# Altium footprint library hphonglib.PcbLib: 1250 footprints (part 67 of 79)
Each footprint in its own frame and in the unit in brackets; x right, y up, seen from the top. Pads: shape width x height; smd on the part's side, far side on the other; paste and mask are expansions set on the pad; w line width, h text height; cw(c..) or ccw(c..) is an arc to the next point about the centre after c.
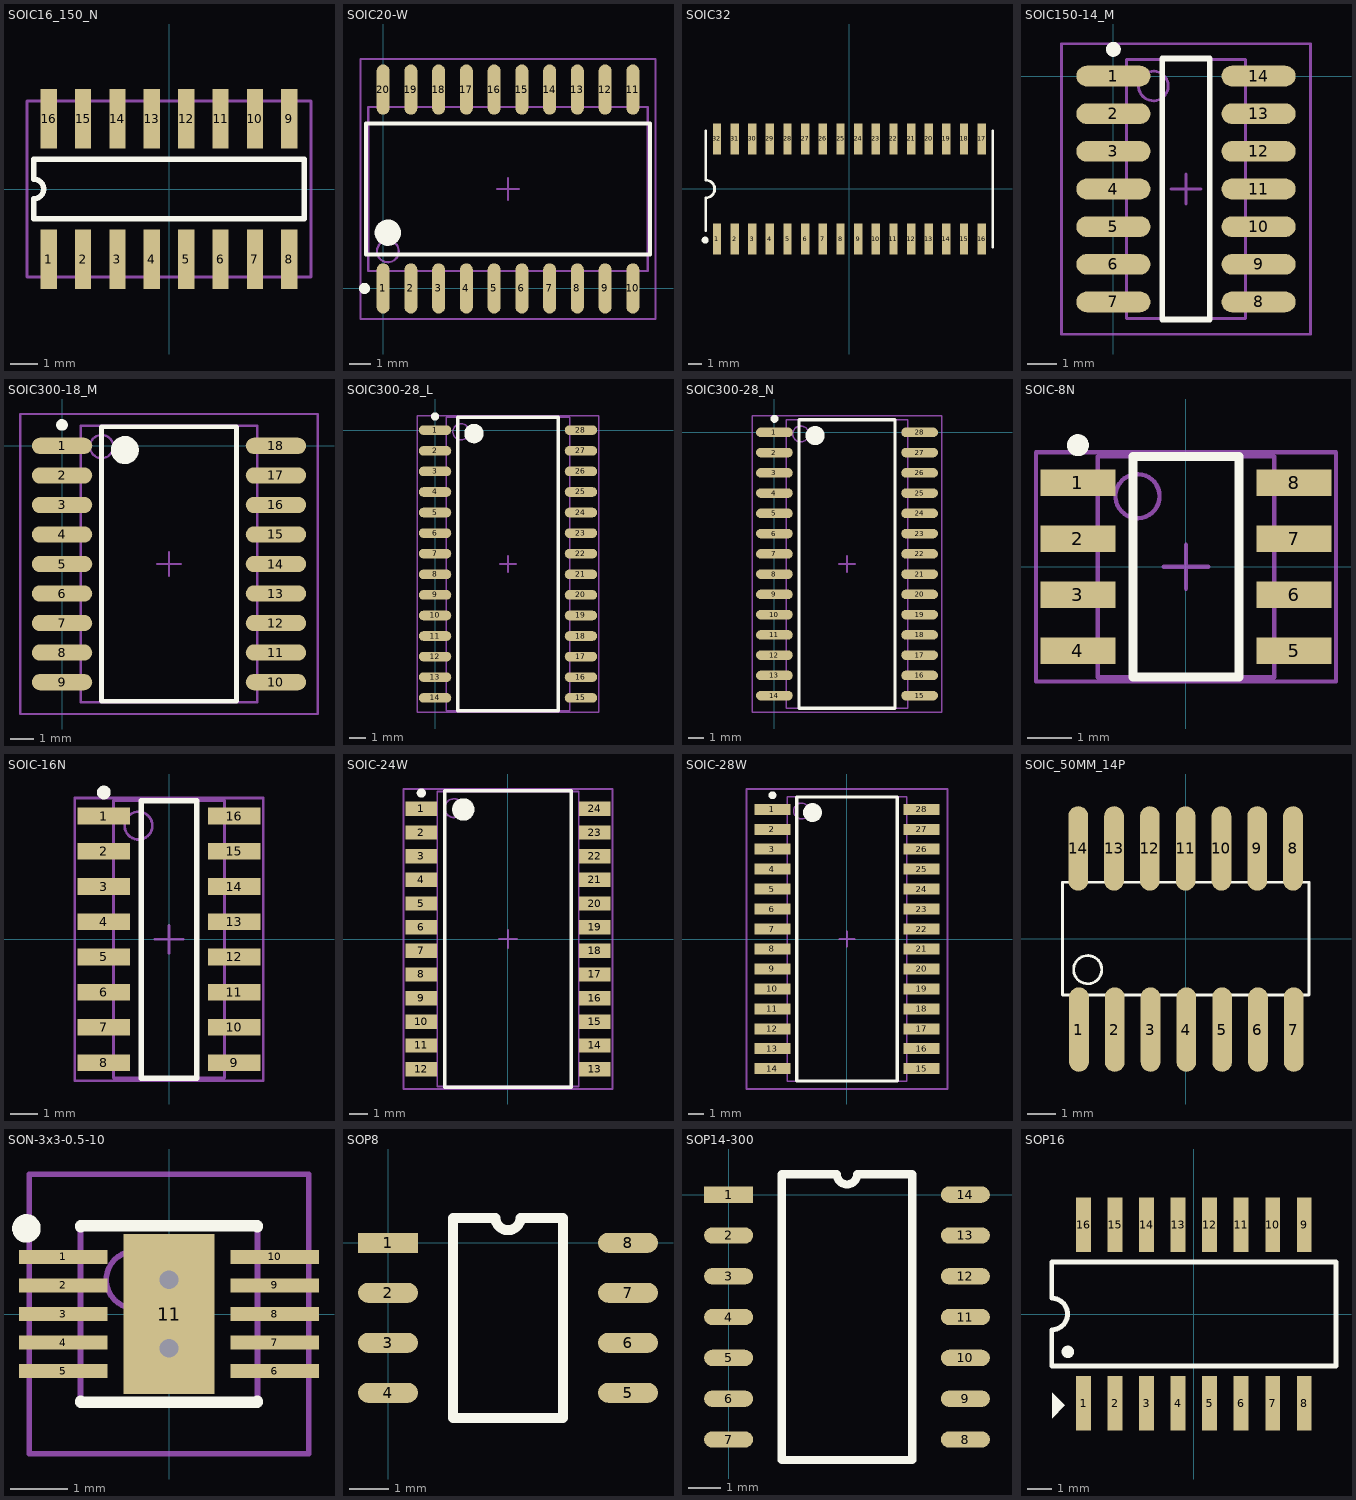
[diagram p66: the footprints below, top view; thin cyan lines are the x and y axes]

## SOIC16_150_N [mm] "Small Outline; 16 Leads; Body Width 3.5 mm; Pitch 1.27 mm"
pads (16):
  rect 0.6x2.2 smd: 1(-4.445,-2.6) 2(-3.175,-2.6) 3(-1.905,-2.6) 4(-0.635,-2.6) 5(0.635,-2.6) 6(1.905,-2.6) 7(3.175,-2.6) 8(4.445,-2.6) 9(4.445,2.6) 10(3.175,2.6) 11(1.905,2.6) 12(0.635,2.6) 13(-0.635,2.6) 14(-1.905,2.6) 15(-3.175,2.6) 16(-4.445,2.6)
Top Overlay:
  lines w0.2: -5,-1.1 5,-1.1 5,1.1 -5,1.1 -5,0.367 cw(c-5,0) -5,-0.367 -5,-1.1
Mechanical 15:
  lines w0.1: -5.25,-3.25 -5.25,3.25 5.25,3.25 5.25,-3.25 -5.25,-3.25
3D body "SOIC16-150.STEP": height 1.75, standoff 0, extent -4.9,-2.875 4.9,2.925

## SOIC20-W [mm] "SOIC, 20-Leads, Body 12.8x7.5mm, Pitch 1.27mm, IPC Medium Density"
height 2.65
pads (20):
  oval 0.6x2.3 smd: 1(0,0) 2(1.27,0) 3(2.54,0) 4(3.81,0) 5(5.08,0) 6(6.35,0) 7(7.62,0) 8(8.89,0) 9(10.16,0) 10(11.43,0) 11(11.43,9.1) 12(10.16,9.1) 13(8.89,9.1) 14(7.62,9.1) 15(6.35,9.1) 16(5.08,9.1) 17(3.81,9.1) 18(2.54,9.1) 19(1.27,9.1) 20(0,9.1)
Top Overlay:
  circle w0.6: c0.215,2.55 r0.3
  circle w0.25: c-0.85,0 r0.125
  lines w0.2: -0.785,1.55 -0.785,7.55 12.215,7.55 12.215,1.55 -0.785,1.55
Mechanical 13:
  circle w0.1: c0.215,1.7 r0.5
  lines w0.1: -0.685,0.8 -0.685,8.3 12.115,8.3 12.115,0.8 -0.685,0.8
Mechanical 15:
  lines w0.1: 5.215,4.55 6.215,4.55 ; 5.715,4.05 5.715,5.05 ; -1.035,-1.4 -1.035,10.5 12.465,10.5 12.465,-1.4 -1.035,-1.4
3D body: height 2.65, standoff 0, extent -0.685,0.8 12.115,8.3

## SOIC32 [mm] "Small Outline; 32 Leads; Body Width 5.2 mm; Pitch 1.27 mm"
pads (32):
  rect 0.6x2.2 smd: 1(-9.525,-3.6) 2(-8.255,-3.6) 3(-6.985,-3.6) 4(-5.715,-3.6) 5(-4.445,-3.6) 6(-3.175,-3.6) 7(-1.905,-3.6) 8(-0.635,-3.6) 9(0.635,-3.6) 10(1.905,-3.6) 11(3.175,-3.6) 12(4.445,-3.6) 13(5.715,-3.6) 14(6.985,-3.6) 15(8.255,-3.6) 16(9.525,-3.6) 17(9.525,3.6) 18(8.255,3.6) 19(6.985,3.6) 20(5.715,3.6) 21(4.445,3.6) 22(3.175,3.6) 23(1.905,3.6) 24(0.635,3.6) 25(-0.635,3.6) 26(-1.905,3.6) 27(-3.175,3.6) 28(-4.445,3.6) 29(-5.715,3.6) 30(-6.985,3.6) 31(-8.255,3.6) 32(-9.525,3.6)
Top Overlay:
  circle w0.25: c-10.375,-3.676 r0.125
  lines w0.2: -10.325,-2.996 -10.325,-0.635 ccw(c-10.325,0) -10.325,0.635 -10.325,4.191 ; 10.325,-4.191 10.325,4.191

## SOIC150-14_M [mm] "SOIC, 14-Leads, Body 8.7x3.9mm, Pitch 1.27mm, IPC Low Density"
height 1.76
pads (14):
  oval 2.5x0.7 smd: 1(0,0) 2(0,-1.27) 3(0,-2.54) 4(0,-3.81) 5(0,-5.08) 6(0,-6.35) 7(0,-7.62) 8(4.9,-7.62) 9(4.9,-6.35) 10(4.9,-5.08) 11(4.9,-3.81) 12(4.9,-2.54) 13(4.9,-1.27) 14(4.9,0)
Top Overlay:
  circle w0.25: c0,0.9 r0.125
  lines w0.2: 1.65,-8.21 3.25,-8.21 3.25,0.59 1.65,0.59 1.65,-8.21
Mechanical 13:
  circle w0.1: c1.35,-0.335 r0.5
  lines w0.1: 0.45,-8.185 4.45,-8.185 4.45,0.565 0.45,0.565 0.45,-8.185
Mechanical 15:
  lines w0.1: 1.95,-3.81 2.95,-3.81 ; 2.45,-4.31 2.45,-3.31 ; -1.75,-8.71 6.65,-8.71 6.65,1.09 -1.75,1.09 -1.75,-8.71
3D body: height 0.25, standoff 0.01, extent -0.575,-4.05 0.525,-3.55
3D body: height 0.25, standoff 0.01, extent -0.575,-1.5 0.525,-1
3D body: height 0.25, standoff 0.01, extent -0.575,-2.775 0.525,-2.275
3D body: height 0.25, standoff 0.01, extent -0.575,-0.25 0.525,0.25
3D body: height 0.25, standoff 0.01, extent -0.525,-6.6 0.575,-6.1
3D body: height 0.25, standoff 0.01, extent -0.525,-7.875 0.575,-7.375
3D body: height 0.25, standoff 0.01, extent -0.525,-5.35 0.575,-4.85
3D body: height 0.25, standoff 0.01, extent 4.3,-0.225 5.4,0.275
3D body: height 0.25, standoff 0.01, extent 4.3,-2.775 5.4,-2.275
3D body: height 0.25, standoff 0.01, extent 4.3,-1.5 5.4,-1
3D body: height 0.25, standoff 0.01, extent 4.3,-4.025 5.4,-3.525
3D body: height 0.25, standoff 0.01, extent 4.35,-6.6 5.45,-6.1
3D body: height 0.25, standoff 0.01, extent 4.35,-5.325 5.45,-4.825
3D body: height 0.25, standoff 0.01, extent 4.35,-7.85 5.45,-7.35
3D body: height 1.76, standoff 1.74, extent 0.775,-0.575 1.575,0.2
3D body: height 1.75, standoff 0, extent 0.45,-8.185 4.45,0.565

## SOIC300-18_M [mm] "SOIC, 18-Leads, Body 11.5x7.5mm, Pitch 1.27mm, IPC Low Density"
height 2.65
pads (18):
  oval 2.6x0.7 smd: 1(0,0) 2(0,-1.27) 3(0,-2.54) 4(0,-3.81) 5(0,-5.08) 6(0,-6.35) 7(0,-7.62) 8(0,-8.89) 9(0,-10.16) 10(9.2,-10.16) 11(9.2,-8.89) 12(9.2,-7.62) 13(9.2,-6.35) 14(9.2,-5.08) 15(9.2,-3.81) 16(9.2,-2.54) 17(9.2,-1.27) 18(9.2,0)
Top Overlay:
  circle w0.25: c0,0.9 r0.125
  circle w0.6: c2.7,-0.18 r0.3
  lines w0.2: 1.7,-10.98 1.7,0.82 7.5,0.82 7.5,-10.98 1.7,-10.98
Mechanical 13:
  circle w0.1: c1.7,-0.03 r0.5
  lines w0.1: 0.8,-11.03 0.8,0.87 8.4,0.87 8.4,-11.03 0.8,-11.03
Mechanical 15:
  lines w0.1: 4.1,-5.08 5.1,-5.08 ; 4.6,-5.58 4.6,-4.58 ; -1.8,-11.53 -1.8,1.37 11,1.37 11,-11.53 -1.8,-11.53
3D body: height 2.65, standoff 0, extent 0.8,-11.03 8.4,0.87

## SOIC300-28_L [mm] "SOIC, 28-Leads, Body 17.9x7.5mm, Pitch 1.27mm, IPC High Density"
height 2.65
pads (28):
  oval 2x0.6 smd: 1(0,0) 2(0,-1.27) 3(0,-2.54) 4(0,-3.81) 5(0,-5.08) 6(0,-6.35) 7(0,-7.62) 8(0,-8.89) 9(0,-10.16) 10(0,-11.43) 11(0,-12.7) 12(0,-13.97) 13(0,-15.24) 14(0,-16.51) 15(9,-16.51) 16(9,-15.24) 17(9,-13.97) 18(9,-12.7) 19(9,-11.43) 20(9,-10.16) 21(9,-8.89) 22(9,-7.62) 23(9,-6.35) 24(9,-5.08) 25(9,-3.81) 26(9,-2.54) 27(9,-1.27) 28(9,0)
Top Overlay:
  circle w0.6: c2.4,-0.205 r0.3
  circle w0.25: c0,0.85 r0.125
  lines w0.2: 1.4,-17.305 7.6,-17.305 7.6,0.795 1.4,0.795 1.4,-17.305
Mechanical 13:
  circle w0.1: c1.6,-0.1 r0.5
  lines w0.1: 0.7,-17.31 8.3,-17.31 8.3,0.8 0.7,0.8 0.7,-17.31
Mechanical 15:
  lines w0.1: 4,-8.255 5,-8.255 ; 4.5,-8.755 4.5,-7.755 ; -1.1,-17.405 10.1,-17.405 10.1,0.895 -1.1,0.895 -1.1,-17.405
3D body: height 2.65, standoff 0, extent 0.7,-17.31 8.3,0.8

## SOIC300-28_N [mm] "SOIC, 28-Leads, Body 17.9x7.5mm, Pitch 1.27mm, IPC Medium Density"
height 2.65
pads (28):
  oval 2.3x0.6 smd: 1(0,0) 2(0,-1.27) 3(0,-2.54) 4(0,-3.81) 5(0,-5.08) 6(0,-6.35) 7(0,-7.62) 8(0,-8.89) 9(0,-10.16) 10(0,-11.43) 11(0,-12.7) 12(0,-13.97) 13(0,-15.24) 14(0,-16.51) 15(9.1,-16.51) 16(9.1,-15.24) 17(9.1,-13.97) 18(9.1,-12.7) 19(9.1,-11.43) 20(9.1,-10.16) 21(9.1,-8.89) 22(9.1,-7.62) 23(9.1,-6.35) 24(9.1,-5.08) 25(9.1,-3.81) 26(9.1,-2.54) 27(9.1,-1.27) 28(9.1,0)
Top Overlay:
  circle w0.6: c2.55,-0.205 r0.3
  circle w0.25: c0,0.85 r0.125
  lines w0.2: 1.55,-17.305 7.55,-17.305 7.55,0.795 1.55,0.795 1.55,-17.305
Mechanical 13:
  circle w0.1: c1.65,-0.1 r0.5
  lines w0.1: 0.75,-17.31 8.35,-17.31 8.35,0.8 0.75,0.8 0.75,-17.31
Mechanical 15:
  lines w0.1: 4.05,-8.255 5.05,-8.255 ; 4.55,-8.755 4.55,-7.755 ; -1.4,-17.555 10.5,-17.555 10.5,1.045 -1.4,1.045 -1.4,-17.555
3D body "SOIC28-300.STEP": height 2.67, standoff 0.07, extent -0.75,-17.31 9.85,0.79

## SOIC-8N [mm] "SOIC, 8-Leads, Body 4.9x3.9mm, Pitch 1.27mm, IPC High Density"
height 2.72
pads (8):
  rect 1.7x0.6 smd: 1(-2.45,1.905) 2(-2.45,0.635) 3(-2.45,-0.635) 4(-2.45,-1.905) 5(2.45,-1.905) 6(2.45,-0.635) 7(2.45,0.635) 8(2.45,1.905)
Top Overlay:
  circle w0.25: c-2.45,2.755 r0.125
  lines w0.2: -1.2,-2.5 1.2,-2.5 1.2,2.5 -1.2,2.5 -1.2,-2.5
Mechanical 13:
  circle w0.1: c-1.1,1.6 r0.5
  lines w0.1: -2,-2.5 2,-2.5 2,2.5 -2,2.5 -2,-2.5
Mechanical 15:
  lines w0.1: -0.5,0 0.5,0 ; 0,-0.5 0,0.5 ; -3.4,-2.6 3.4,-2.6 3.4,2.6 -3.4,2.6 -3.4,-2.6
3D body "SOIC-8N.step": height 1.7, standoff 0, extent -3.099,-2.413 3.099,2.413

## SOIC-16N [mm] "SOIC, 16-Leads, Body 9.9x3.9mm, Pitch 1.27mm, IPC High Density"
height 1.75
pads (16):
  rect 1.9x0.6 smd: 1(-2.35,4.445) 2(-2.35,3.175) 3(-2.35,1.905) 4(-2.35,0.635) 5(-2.35,-0.635) 6(-2.35,-1.905) 7(-2.35,-3.175) 8(-2.35,-4.445) 9(2.35,-4.445) 10(2.35,-3.175) 11(2.35,-1.905) 12(2.35,-0.635) 13(2.35,0.635) 14(2.35,1.905) 15(2.35,3.175) 16(2.35,4.445)
Top Overlay:
  circle w0.25: c-2.35,5.295 r0.125
  lines w0.2: -1,-5 -1,5 1,5 1,-5 -1,-5
Mechanical 13:
  circle w0.1: c-1.1,4.1 r0.5
  lines w0.1: -2,-5 -2,5 2,5 2,-5 -2,-5
Mechanical 15:
  lines w0.1: -0.5,0 0.5,0 ; 0,-0.5 0,0.5 ; -3.4,-5.1 -3.4,5.1 3.4,5.1 3.4,-5.1 -3.4,-5.1
3D body "SOIC-16N.step": height 1.7, standoff 0, extent -3.099,-4.953 3.099,4.953

## SOIC-24W [mm] "SOIC, 24-Leads, Body 15.4x7.5mm, Pitch 1.27mm, IPC High Density"
height 2.67
pads (24):
  rect 1.7x0.762 smd: 1(-4.65,6.985) 2(-4.65,5.715) 3(-4.65,4.445) 4(-4.65,3.175) 5(-4.65,1.905) 6(-4.65,0.635) 7(-4.65,-0.635) 8(-4.65,-1.905) 9(-4.65,-3.175) 10(-4.65,-4.445) 11(-4.65,-5.715) 12(-4.65,-6.985) 13(4.65,-6.985) 14(4.65,-5.715) 15(4.65,-4.445) 16(4.65,-3.175) 17(4.65,-1.905) 18(4.65,-0.635) 19(4.65,0.635) 20(4.65,1.905) 21(4.65,3.175) 22(4.65,4.445) 23(4.65,5.715) 24(4.65,6.985)
Top Overlay:
  circle w0.6: c-2.4,6.95 r0.3
  circle w0.25: c-4.65,7.835 r0.125
  lines w0.2: -3.4,-7.95 3.4,-7.95 3.4,7.95 -3.4,7.95 -3.4,-7.95
Mechanical 13:
  circle w0.1: c-2.9,7.025 r0.5
  lines w0.1: -3.8,-7.925 3.8,-7.925 3.8,7.925 -3.8,7.925 -3.8,-7.925
Mechanical 15:
  lines w0.1: -0.5,0 0.5,0 ; 0,-0.5 0,0.5 ; -5.6,-8.05 5.6,-8.05 5.6,8.05 -5.6,8.05 -5.6,-8.05
3D body "SOIC-24W.step": height 1.7, standoff 0, extent -5.321,-7.493 5.321,7.493

## SOIC-28W [mm] "SOIC, 28-Leads, Body 17.9x7.5mm, Pitch 1.27mm, IPC Low Density"
height 2.65
pads (28):
  rect 2.3x0.7 smd: 1(-4.75,8.255) 2(-4.75,6.985) 3(-4.75,5.715) 4(-4.75,4.445) 5(-4.75,3.175) 6(-4.75,1.905) 7(-4.75,0.635) 8(-4.75,-0.635) 9(-4.75,-1.905) 10(-4.75,-3.175) 11(-4.75,-4.445) 12(-4.75,-5.715) 13(-4.75,-6.985) 14(-4.75,-8.255) 15(4.75,-8.255) 16(4.75,-6.985) 17(4.75,-5.715) 18(4.75,-4.445) 19(4.75,-3.175) 20(4.75,-1.905) 21(4.75,-0.635) 22(4.75,0.635) 23(4.75,1.905) 24(4.75,3.175) 25(4.75,4.445) 26(4.75,5.715) 27(4.75,6.985) 28(4.75,8.255)
Top Overlay:
  circle w0.25: c-4.75,9.155 r0.125
  circle w0.6: c-2.2,8.05 r0.3
  lines w0.2: -3.2,-9.05 -3.2,9.05 3.2,9.05 3.2,-9.05 -3.2,-9.05
Mechanical 13:
  circle w0.1: c-2.9,8.15 r0.5
  lines w0.1: -3.8,-9.05 -3.8,9.05 3.8,9.05 3.8,-9.05 -3.8,-9.05
Mechanical 15:
  lines w0.1: -0.5,0 0.5,0 ; 0,-0.5 0,0.5 ; -6.4,-9.55 -6.4,9.55 6.4,9.55 6.4,-9.55 -6.4,-9.55
3D body "SOIC-28W.step": height 1.7, standoff 0, extent -5.347,-8.763 5.296,8.763

## SOIC_50MM_14P [mm] "SOIC, 14-Leads, Body 8.7x3.9mm, Pitch 1.27mm, IPC Low Density"
height 1.75
pads (14):
  oval 0.7x3 smd: 1(-3.785,-3.226) 2(-2.515,-3.226) 3(-1.245,-3.226) 4(0.025,-3.226) 5(1.295,-3.226) 6(2.565,-3.226) 7(3.835,-3.226) 8(3.81,3.2) 9(2.54,3.2) 10(1.27,3.2) 11(0,3.2) 12(-1.27,3.2) 13(-2.54,3.2) 14(-3.81,3.2)
Top Layer:
  lines w0.254: 0,-3.2 0.025,-3.226
Top Overlay:
  circle w0.1: c-3.475,-1.1 r0.5
  lines w0.1: -4.375,-2 -4.375,2 4.375,2 4.375,-2 -4.375,-2
3D body "User Library-SOP14-p127-780.step": height 1.1, standoff 0, extent -5.08,-3.642 5.12,3.658

## SON-3x3-0.5-10 [mm] "SON, 10-Leads, Body 3x3 mm, Pitch 0.5mm, IPC Low Density"
height 0.8
pads (11):
  rect 1.55x0.25 smd: 1(-1.855,1) 2(-1.855,0.5) 3(-1.855,0) 4(-1.855,-0.5) 5(-1.855,-1) 6(1.855,-1) 7(1.855,-0.5) 8(1.855,0) 9(1.855,0.5) 10(1.855,1)
  rect 1.6x2.8 smd: 11(0,0)
via 0,-0.6 diameter 0.66 hole 0.33
via 0,0.6 diameter 0.66 hole 0.33
Top Overlay:
  circle w0.25: c-2.5,1.5 r0.125
  lines w0.2: -1.55,-1.525 -1.55,-1.55 1.55,-1.55 1.55,-1.525 ; -1.55,1.525 -1.55,1.55 1.55,1.55 1.55,1.525
Mechanical 13:
  circle w0.1: c-0.6,0.6 r0.5
  lines w0.1: -1.55,-1.55 -1.55,1.55 1.55,1.55 1.55,-1.55 -1.55,-1.55
Mechanical 15:
  lines w0.1: -0.5,0 0.5,0 ; 0,-0.5 0,0.5 ; -2.45,-2.45 -2.45,2.45 2.45,2.45 2.45,-2.45 -2.45,-2.45
3D body "SOP-4.9x1.1-0.5-10.step": height 1.25, standoff 0, extent -2.478,-1.55 2.478,1.55

## SOP8 [mil]
pads (8):
  rect 60x20 smd: 1(0,0)
  oval 60x20 smd: 2(0,-50) 3(0,-100) 4(0,-150) 5(240,-150) 6(240,-100) 7(240,-50) 8(240,0)
Top Overlay:
  lines w10: 65,-175 65,25 107.5,25 ccw(c120,25) 132.5,25 175,25 175,-175 65,-175
3D body "User Library-HSOP8-1.STEP": height 68.31, standoff -0.59, extent 0.95,-174.85 245.05,22

## SOP14-300 [mil]
pads (14):
  rect 60x20 smd: 1(0,0)
  oval 60x20 smd: 2(0,-50) 3(0,-100) 4(0,-150) 5(0,-200) 6(0,-250) 7(0,-300) 8(290,-300) 9(290,-250) 10(290,-200) 11(290,-150) 12(290,-100) 13(290,-50) 14(290,0)
Top Overlay:
  lines w10: 65,-325 65,25 132.5,25 ccw(c145,25) 157.5,25 225,25 225,-325 65,-325
3D body "User Library-SOP14-p127-780.STEP": height 43.31, standoff 0, extent 4.02,-353.15 291.42,48.42

## SOP16 [mm] "Small Outline; 16 Leads; Body Width 5.6 mm; Pitch 1.27 mm"
height 2
pads (16):
  rect 0.6x2.2 smd: 1(-4.445,-3.6) 2(-3.175,-3.6) 3(-1.905,-3.6) 4(-0.635,-3.6) 5(0.635,-3.6) 6(1.905,-3.6) 7(3.175,-3.6) 8(4.445,-3.6) 9(4.445,3.6) 10(3.175,3.6) 11(1.905,3.6) 12(0.635,3.6) 13(-0.635,3.6) 14(-1.905,3.6) 15(-3.175,3.6) 16(-4.445,3.6)
Top Overlay:
  circle w0.25: c-5.078,-1.524 r0.125
  region: -5.715,-4.191 -5.207,-3.683 -5.715,-3.175
  lines w0.2: -5.725,-2.1 -5.725,-0.635 ccw(c-5.725,0) -5.725,0.635 -5.725,2.1 5.725,2.1 5.725,-2.1 -5.725,-2.1